# Altium integrated library iuh-thuc-hanh.IntLib: 62 symbols
Pins are listed as number, name and electrical type; pins without a type are passive.

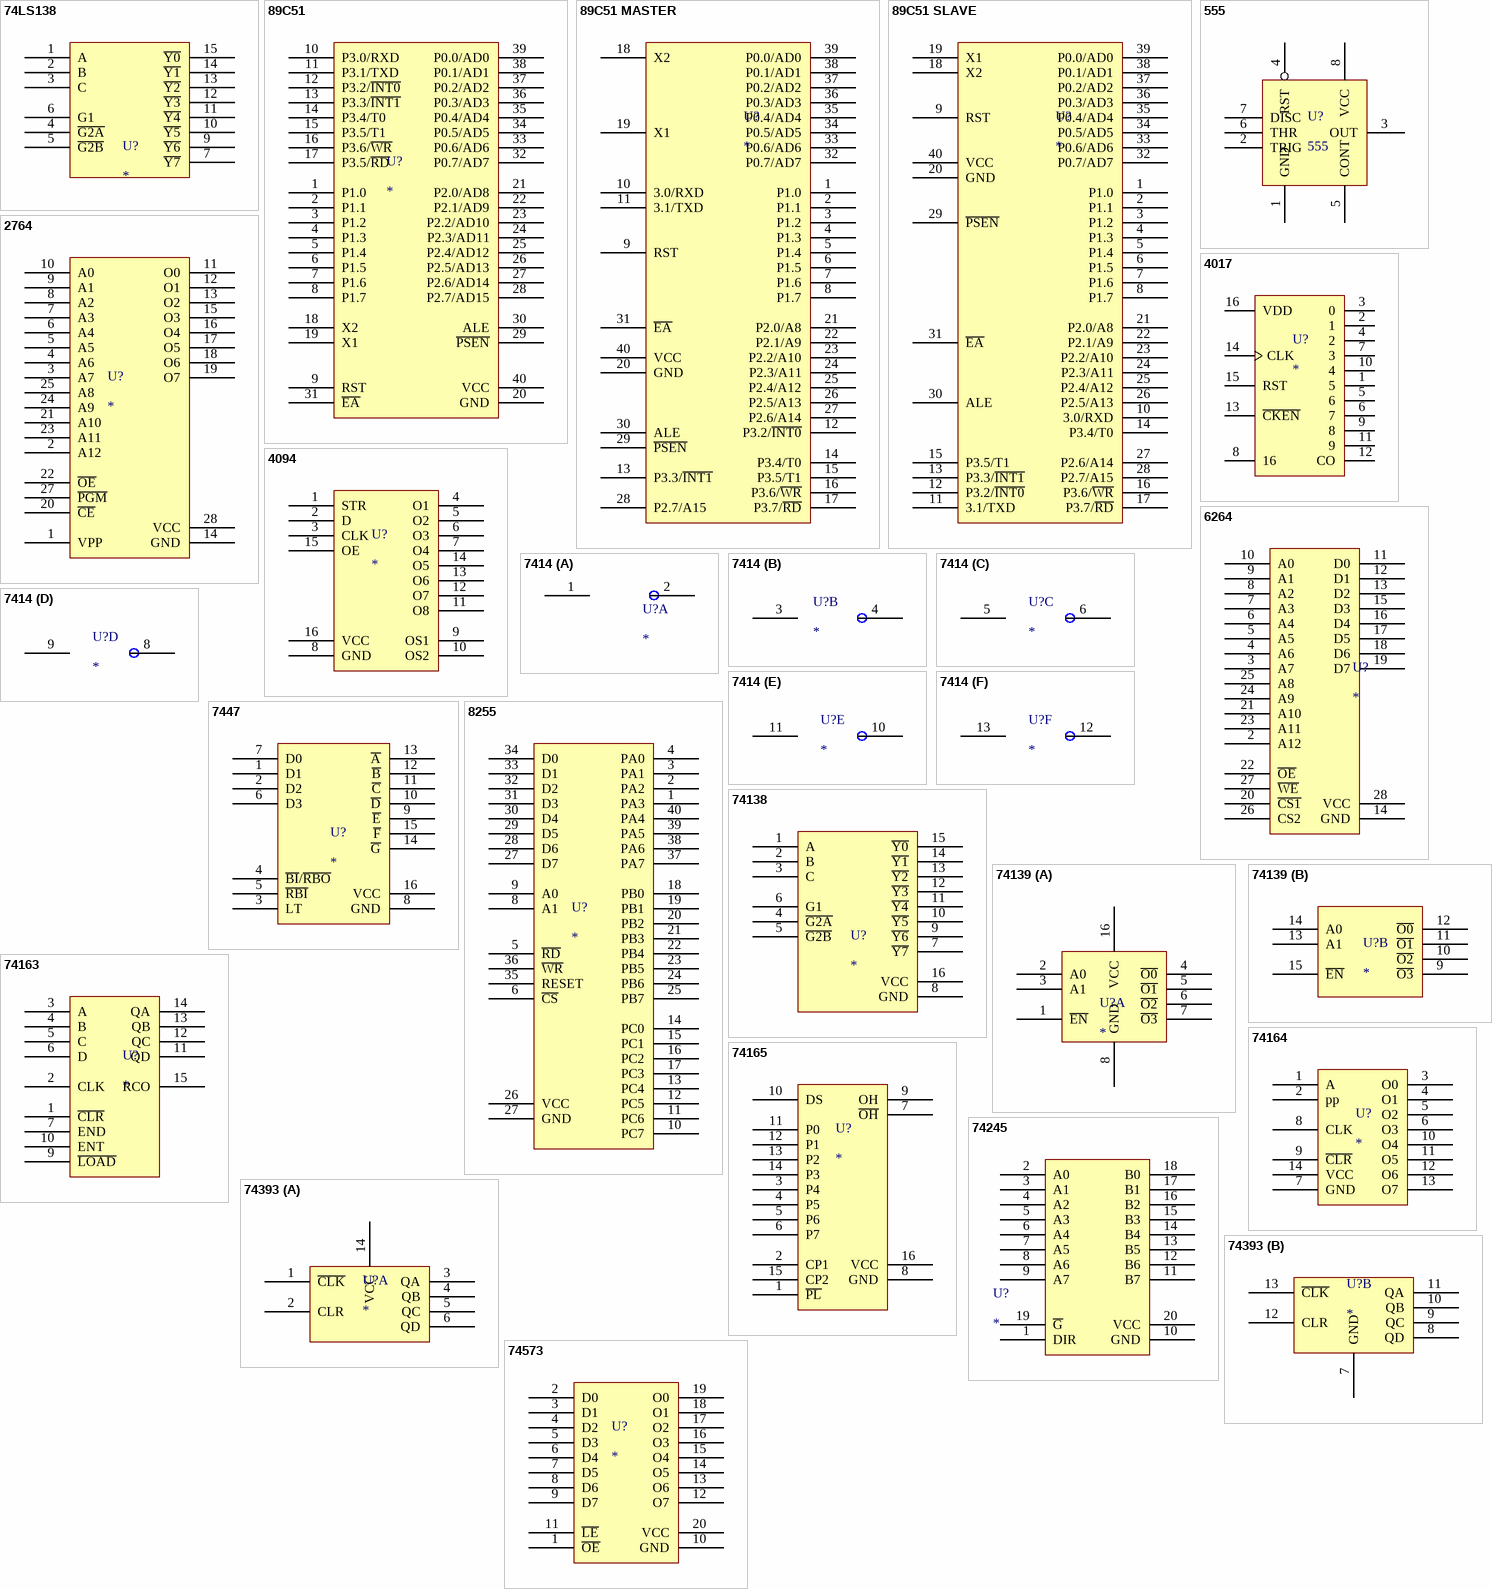
[diagram p0: symbols 74LS138 to 74573]

## 74LS138
designator U?
pins: 1 A, 2 B, 3 C, 4 ~{G2A}, 5 ~{G2B}, 6 G1, 7 ~{Y7}, 9 ~{Y6}, 10 ~{Y5}, 11 ~{Y4}, 12 ~{Y3}, 13 ~{Y2}, 14 ~{Y1}, 15 ~{Y0}

## 89C51
designator U?
pins: 1 P1.0, 2 P1.1, 3 P1.2, 4 P1.3, 5 P1.4, 6 P1.5, 7 P1.6, 8 P1.7, 9 RST, 10 P3.0/RXD, 11 P3.1/TXD, 12 P3.2/~{INT0}, 13 P3.3/~{INT1}, 14 P3.4/T0, 15 P3.5/T1, 16 P3.6/~{WR}, 17 P3.5/~{RD}, 18 X2, 19 X1, 20 GND, 21 P2.0/AD8, 22 P2.1/AD9, 23 P2.2/AD10, 24 P2.3/AD11, 25 P2.4/AD12, 26 P2.5/AD13, 27 P2.6/AD14, 28 P2.7/AD15, 29 ~{PSEN}, 30 ALE, 31 ~{EA}, 32 P0.7/AD7, 33 P0.6/AD6, 34 P0.5/AD5, 35 P0.4/AD4, 36 P0.3/AD3, 37 P0.2/AD2, 38 P0.1/AD1, 39 P0.0/AD0, 40 VCC

## 89C51 MASTER
designator U?
pins: 1 P1.0, 2 P1.1, 3 P1.2, 4 P1.3, 5 P1.4, 6 P1.5, 7 P1.6, 8 P1.7, 9 RST, 10 3.0/RXD, 11 3.1/TXD, 12 P3.2/~{INT0}, 13 P3.3/~{INT1}, 14 P3.4/T0, 15 P3.5/T1, 16 P3.6/~{WR}, 17 P3.7/~{RD}, 18 X2, 19 X1, 20 GND, 21 P2.0/A8, 22 P2.1/A9, 23 P2.2/A10, 24 P2.3/A11, 25 P2.4/A12, 26 P2.5/A13, 27 P2.6/A14, 28 P2.7/A15, 29 ~{PSEN}, 30 ALE, 31 ~{EA}, 32 P0.7/AD7, 33 P0.6/AD6, 34 P0.5/AD5, 35 P0.4/AD4, 36 P0.3/AD3, 37 P0.2/AD2, 38 P0.1/AD1, 39 P0.0/AD0, 40 VCC

## 89C51 SLAVE
designator U?
pins: 1 P1.0, 2 P1.1, 3 P1.2, 4 P1.3, 5 P1.4, 6 P1.5, 7 P1.6, 8 P1.7, 9 RST, 10 3.0/RXD, 11 3.1/TXD, 12 P3.2/~{INT0}, 13 P3.3/~{INT1}, 14 P3.4/T0, 15 P3.5/T1, 16 P3.6/~{WR}, 17 P3.7/~{RD}, 18 X2, 19 X1, 20 GND, 21 P2.0/A8, 22 P2.1/A9, 23 P2.2/A10, 24 P2.3/A11, 25 P2.4/A12, 26 P2.5/A13, 27 P2.6/A14, 28 P2.7/A15, 29 ~{PSEN}, 30 ALE, 31 ~{EA}, 32 P0.7/AD7, 33 P0.6/AD6, 34 P0.5/AD5, 35 P0.4/AD4, 36 P0.3/AD3, 37 P0.2/AD2, 38 P0.1/AD1, 39 P0.0/AD0, 40 VCC

## 555
designator U?
LM555; Manufacturer: National Semiconductor Corporation; ComponentLink1Description: Datasheet; ComponentLink1URL: https://datasheet.ciiva.com/19457/840579-19457377.pdf?src-supplier=Jameco
footprint DIP8 (8 PIN, Width 300mil, Pin to pin 100mil)
pins: 1 GND, 2 TRIG, 3 OUT, 4 RST, 5 CONT, 6 THR, 7 DISC, 8 VCC

## 2764
designator U?
pins: 1 VPP, 2 A12, 3 A7, 4 A6, 5 A5, 6 A4, 7 A3, 8 A2, 9 A1, 10 A0, 11 O0, 12 O1, 13 O2, 14 GND, 15 O3, 16 O4, 17 O5, 18 O6, 19 O7, 20 ~{CE}, 21 A10, 22 ~{OE}, 23 A11, 24 A9, 25 A8, 27 ~{PGM}, 28 VCC

## 4017
designator U?
footprint DIP16 (16 PIN, W 300mil, Pin to pin 100mil)
footprint SOP16 (SOIC, 16-Leads, Body 9.90x3.91mm, Pitch 1.27mm, IPC Medium Density)
pins: 1 5, 2 1, 3 0, 4 2, 5 6, 6 7, 7 3, 8 16, 9 8, 10 4, 11 9, 12 CO, 13 ~{CKEN}, 14 CLK, 15 RST, 16 VDD

## 4094
designator U?
pins: 1 STR, 2 D, 3 CLK, 4 O1, 5 O2, 6 O3, 7 O4, 8 GND, 9 OS1, 10 OS2, 11 O8, 12 O7, 13 O6, 14 O5, 15 OE, 16 VCC

## 6264
designator U?
pins: 2 A12, 3 A7, 4 A6, 5 A5, 6 A4, 7 A3, 8 A2, 9 A1, 10 A0, 11 D0, 12 D1, 13 D2, 14 GND, 15 D3, 16 D4, 17 D5, 18 D6, 19 D7, 20 ~{CS1}, 21 A10, 22 ~{OE}, 23 A11, 24 A9, 25 A8, 26 CS2, 27 ~{WE}, 28 VCC

## 7414
designator U?
part A pins: 1, 2
part B pins: 3, 4
part C pins: 5, 6
part D pins: 8, 9
part E pins: 10, 11
part F pins: 12, 13

## 7447
designator U?
pins: 1 D1, 2 D2, 3 LT, 4 ~{BI}/~{RBO}, 5 ~{RBI}, 6 D3, 7 D0, 8 GND, 9 ~{E}, 10 ~{D}, 11 ~{C}, 12 ~{B}, 13 ~{A}, 14 ~{G}, 15 ~{F}, 16 VCC

## 8255
designator U?
pins: 1 PA3, 2 PA2, 3 PA1, 4 PA0, 5 ~{RD}, 6 ~{CS}, 8 A1, 9 A0, 10 PC7, 11 PC6, 12 PC5, 13 PC4, 14 PC0, 15 PC1, 16 PC2, 17 PC3, 18 PB0, 19 PB1, 20 PB2, 21 PB3, 22 PB4, 23 PB5, 24 PB6, 25 PB7, 26 VCC, 27 D7, 27 GND, 28 D6, 29 D5, 30 D4, 31 D3, 32 D2, 33 D1, 34 D0, 35 RESET, 36 ~{WR}, 37 PA7, 38 PA6, 39 PA5, 40 PA4

## 74138
designator U?
pins: 1 A, 2 B, 3 C, 4 ~{G2A}, 5 ~{G2B}, 6 G1, 7 ~{Y7}, 8 GND, 9 ~{Y6}, 10 ~{Y5}, 11 ~{Y4}, 12 ~{Y3}, 13 ~{Y2}, 14 ~{Y1}, 15 ~{Y0}, 16 VCC

## 74139
designator U?
part A pins: 1 ~{EN}, 2 A0, 3 A1, 4 ~{O0}, 5 ~{O1}, 6 ~{O2}, 7 ~{O3}, 8 GND, 16 VCC
part B pins: 9 ~{O3}, 10 ~{O2}, 11 ~{O1}, 12 ~{O0}, 13 A1, 14 A0, 15 ~{EN}

## 74163
designator U?
pins: 1 ~{CLR}, 2 CLK, 3 A, 4 B, 5 C, 6 D, 7 END, 9 ~{LOAD}, 10 ENT, 11 QD, 12 QC, 13 QB, 14 QA, 15 RCO

## 74164
designator U?
pins: 1 A, 2 pp, 3 O0, 4 O1, 5 O2, 6 O3, 7 GND, 8 CLK, 9 ~{CLR}, 10 O4, 11 O5, 12 O6, 13 O7, 14 VCC

## 74165
designator U?
pins: 1 ~{PL}, 2 CP1, 3 P4, 4 P5, 5 P6, 6 P7, 7 ~{OH}, 8 GND, 9 OH, 10 DS, 11 P0, 12 P1, 13 P2, 14 P3, 15 CP2, 16 VCC

## 74245
designator U?
pins: 1 DIR, 2 A0, 3 A1, 4 A2, 5 A3, 6 A4, 7 A5, 8 A6, 9 A7, 10 GND, 11 B7, 12 B6, 13 B5, 14 B4, 15 B3, 16 B2, 17 B1, 18 B0, 19 ~{G}, 20 VCC

## 74393
designator U?
part A pins: 1 ~{CLK}, 2 CLR, 3 QA, 4 QB, 5 QC, 6 QD, 14 VCC
part B pins: 7 GND, 8 QD, 9 QC, 10 QB, 11 QA, 12 CLR, 13 ~{CLK}

## 74573
designator U?
pins: 1 ~{OE}, 2 D0, 3 D1, 4 D2, 5 D3, 6 D4, 7 D5, 8 D6, 9 D7, 10 GND, 11 ~{LE}, 12 O7, 13 O6, 14 O5, 15 O4, 16 O3, 17 O2, 18 O1, 19 O0, 20 VCC

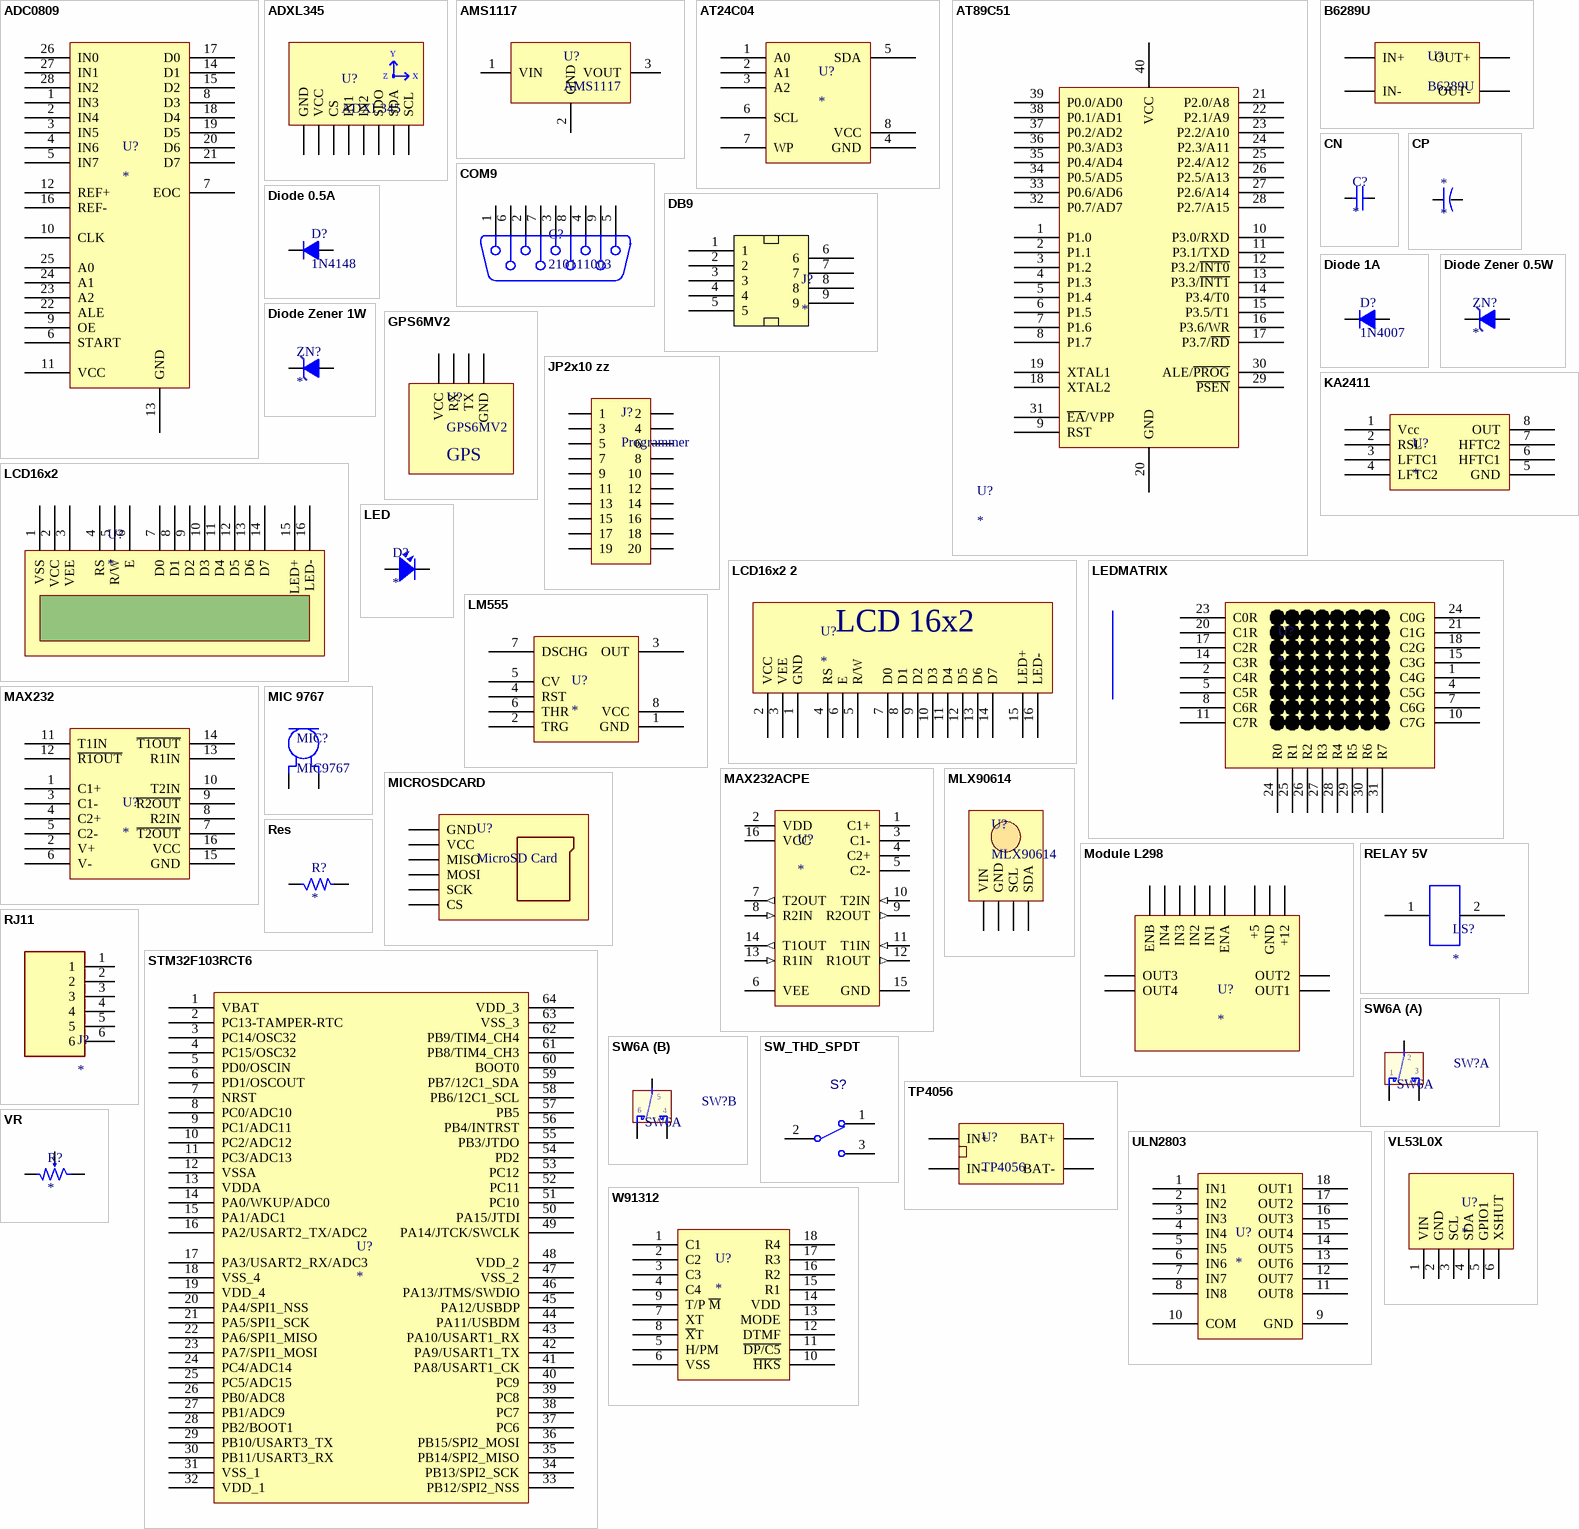
[diagram p1: symbols ADC0809 to W91312]

## ADC0809
designator U?
pins: 1 IN3, 2 IN4, 3 IN5, 4 IN6, 5 IN7, 6 START, 7 EOC, 8 D3, 9 OE, 10 CLK, 11 VCC, 12 REF+, 13 GND, 14 D1, 15 D2, 16 REF-, 17 D0, 18 D4, 19 D5, 20 D6, 21 D7, 22 ALE, 23 A2, 24 A1, 25 A0, 26 IN0, 27 IN1, 28 IN2

## ADXL345
designator U?
Module Cam bien gia toc
pins: 1 GND, 2 VCC, 3 CS, 4 IN1, 5 IN2, 6 SDO, 7 SDA, 8 SCL
text: Y; Z; X

## AMS1117
designator U?
pins: 1 VIN, 2 GND, 3 VOUT

## AT24C04
designator U?
pins: 1 A0, 2 A1, 3 A2, 4 GND, 5 SDA, 6 SCL, 7 WP, 8 VCC

## AT89C51
designator U?
pins: 1 P1.0, 2 P1.1, 3 P1.2, 4 P1.3, 5 P1.4, 6 P1.5, 7 P1.6, 8 P1.7, 9 RST, 10 P3.0/RXD, 11 P3.1/TXD, 12 P3.2/~{INT0}, 13 P3.3/~{INT1}, 14 P3.4/T0, 15 P3.5/T1, 16 P3.6/WR, 17 P3.7/~{RD}, 18 XTAL2, 19 XTAL1, 20 GND, 21 P2.0/A8, 22 P2.1/A9, 23 P2.2/A10, 24 P2.3/A11, 25 P2.4/A12, 26 P2.5/A13, 27 P2.6/A14, 28 P2.7/A15, 29 ~{PSEN}, 30 ALE/~{PROG}, 31 ~{EA}/VPP, 32 P0.7/AD7, 33 P0.6/AD6, 34 P0.5/AD5, 35 P0.4/AD4, 36 P0.3/AD3, 37 P0.2/AD2, 38 P0.1/AD1, 39 P0.0/AD0, 40 VCC

## B6289U
designator U?
Module Buck Boost 5V
pins: 1 IN+, 2 IN-, 3 OUT+, 4 OUT-

## CN
designator C?
Capacitor
footprint Cap 7.5mm
footprint Cap 2.54mm
footprint Cap 3.81mm
footprint Cap 5.08mm
footprint Cap 6.35mm (Tu pin to pin 250mil)
footprint Cap 10mm (Cap np W 0.4)
footprint Cap 15mm
footprint Cap 15mm CBB
footprint Cap 22.5mm
pins: 1, 2

## COM9
designator C?, comment 210111003
DB9 RS232 D-SUB-Filter Connectors WE-DS, Solder Pin Straight; Manufacturer: Würth Elektronik eiSos GmbH; partNo: 210111003; ComponentLink1Description: Manufacturer; ComponentLink1URL: http://www.we-online.de; Created by: Christin Zierenner; Created Date: May 2012; ComponentLink2Description: Datasheet; ComponentLink2URL: http://katalog.we-online.de/kataloge/eisos/index.php?language=en&pf=Filter_gerade
footprint COM9A (D-SUB- 9P, MALE, RT ANGLE, TH)
footprint COM9C (D-SUB- 9P, MALE, SOLDER BUCKET VERTICAL MOUNT, TH)
footprint COM9SMDA (D-SUB- 9P, MALE, RT ANGLE, SMT)
pins: 1, 2, 3, 4, 5, 6, 7, 8, 9

## CP
designator *
Capacitor
pins: 1, 2

## DB9
designator J?
pins: 1, 2, 3, 4, 5, 6, 7, 8, 9

## Diode 0.5A
designator D?, comment 1N4148
Diode 0.5A 1N4148 DO-35
footprint DO-35 (Diode 0.5A)
footprint DO-35 Axial (Diode 0.5A Axial)
pins: 1 A, 2 K

## Diode 1A
designator D?, comment 1N4007
Diode 1A 1N4007 DO-41
footprint DO-41 (Diode 1A)
footprint DO-41 Axial (Diode 1A Axial)
pins: 1 A, 2 K

## Diode Zener 0.5W
designator ZN?
footprint DO-35 (Diode 0.5A)
footprint DO-35 Axial (Diode 0.5A Axial)
pins: 1 A, 2 K

## Diode Zener 1W
designator ZN?
footprint DO-41 (Diode 1A)
footprint DO-41 Axial (Diode 1A Axial)
pins: 1 A, 2 K

## GPS6MV2
designator U?
Module GPS
pins: 1 VCC, 2 RX, 3 TX, 4 GND
text: GPS

## JP2x10 zz
designator J?, comment Programmer
pins: 1, 2, 3, 4, 5, 6, 7, 8, 9, 10, 11, 12, 13, 14, 15, 16, 17, 18, 19, 20

## KA2411
designator U?
footprint DIP8 (8 PIN, Width 300mil, Pin to pin 100mil)
pins: 1 Vcc, 2 RSL, 3 LFTC1, 4 LFTC2, 5 GND, 6 HFTC1, 7 HFTC2, 8 OUT

## LCD16x2
designator U?
LCD 16x2
pins: 1 VSS, 2 VCC, 3 VEE, 4 RS, 5 R/W, 6 E, 7 D0, 8 D1, 9 D2, 10 D3, 11 D4, 12 D5, 13 D6, 14 D7, 15 LED+, 16 LED-

## LCD16x2 2
designator U?
LCD 16x2
pins: 1 GND, 2 VCC, 3 VEE, 4 RS, 5 R/W, 6 E, 7 D0, 8 D1, 9 D2, 10 D3, 11 D4, 12 D5, 13 D6, 14 D7, 15 LED+, 16 LED-

## LED
designator D?
footprint LED-5MM-RED (LED 2 PIN, 5mm, Only colour,pin to pin 100mil)
pins: 1, 2

## LEDMATRIX
designator U?
pins: 1 C4G, 2 C4R, 4 C5G, 5 C5R, 7 C6G, 8 C6R, 10 C7G, 11 C7R, 14 C3R, 15 C3G, 17 C2R, 18 C2G, 20 C1R, 21 C1G, 23 C0R, 24 R0, 24 C0G, 25 R1, 26 R2, 27 R3, 28 R4, 29 R5, 30 R6, 31 R7

## LM555
designator U?
pins: 1 GND, 2 TRG, 3 OUT, 4 RST, 5 CV, 6 THR, 7 DSCHG, 8 VCC

## MAX232
designator U?
pins: 1 C1+, 2 V+, 3 C1-, 4 C2+, 5 C2-, 6 V-, 7 ~{T2OUT}, 8 R2IN, 9 ~{R2OUT}, 10 T2IN, 11 T1IN, 12 ~{R1OUT}, 13 R1IN, 14 ~{T1OUT}, 15 GND, 16 VCC

## MAX232ACPE
designator U?
pins: 1 C1+, 2 VDD, 3 C1-, 4 C2+, 5 C2-, 6 VEE, 7 T2OUT (out), 8 R2IN (in), 9 R2OUT (out), 10 T2IN (in), 11 T1IN (in), 12 R1OUT (out), 13 R1IN (in), 14 T1OUT (out), 15 GND, 16 VCC

## MIC 9767
designator MIC?, comment MIC9767
Microphone 9767 9.7x6.7mm; Pin distance: 2.54mm
footprint MICRONPHONE 9767
pins: 1 VCC (power), 2 GND (power)

## MICROSDCARD
designator U?, comment MicroSD Card
pins: 1 GND, 2 VCC, 3 MISO, 4 MOSI, 5 SCK, 6 CS

## MLX90614
designator U?
Cam bien nhiet do hong ngoai
pins: 1 VIN, 2 GND, 3 SCL, 4 SDA

## Module L298
designator U?
pins: 1 +12, 2 GND, 3 +5, 4 ENA, 5 IN1, 6 IN2, 7 IN3, 8 IN4, 9 ENB, 10 OUT2, 11 OUT1, 11 OUT3, 12 OUT4

## RELAY 5V
designator LS?
pins: 1, 2

## Res
designator R?
footprint RES-1/4W
pins: 1, 2

## RJ11
designator J?
RJ11 6P6C
footprint RJ11 6P6C
pins: 1, 2, 3, 4, 5, 6

## STM32F103RCT6
designator U?
pins: 1 VBAT, 2 PC13-TAMPER-RTC, 3 PC14/OSC32, 4 PC15/OSC32, 5 PD0/OSCIN, 6 PD1/OSCOUT, 7 NRST, 8 PC0/ADC10, 9 PC1/ADC11, 10 PC2/ADC12, 11 PC3/ADC13, 12 VSSA, 13 VDDA, 14 PA0/WKUP/ADC0, 15 PA1/ADC1, 16 PA2/USART2_TX/ADC2, 17 PA3/USART2_RX/ADC3, 18 VSS_4, 19 VDD_4, 20 PA4/SPI1_NSS, 21 PA5/SPI1_SCK, 22 PA6/SPI1_MISO, 23 PA7/SPI1_MOSI, 24 PC4/ADC14, 25 PC5/ADC15, 26 PB0/ADC8, 27 PB1/ADC9, 28 PB2/BOOT1, 29 PB10/USART3_TX, 30 PB11/USART3_RX, 31 VSS_1, 32 VDD_1, 33 PB12/SPI2_NSS, 34 PB13/SPI2_SCK, 35 PB14/SPI2_MISO, 36 PB15/SPI2_MOSI, 37 РС6, 38 PC7, 39 PC8, 40 PC9, 41 PA8/USART1_CK, 42 PA9/USART1_TX, 43 PA10/USART1_RX, 44 PA11/USBDM, 45 PA12/USBDP, 46 PA13/JTMS/SWDIO, 47 VSS_2, 48 VDD_2, 49 PA14/JTCK/SWCLK, 50 PA15/JTDI, 51 PC10, 52 PC11, 53 PC12, 54 PD2, 55 PB3/JTDO, 56 PB4/INTRST, 57 PB5, 58 PB6/12C1_SCL, 59 PB7/12C1_SDA, 60 BOOT0, 61 PB8/TIM4_CH3, 62 PB9/TIM4_CH4, 63 VSS_3, 64 VDD_3

## SW6A
designator SW?
SW-DTDP - 6 Pin; Value: SW6
footprint SWITCH DPDT 7x7mm 2mm
footprint SWITCH DPDT 8x8mm 2.5mm
part A pins: 1, 2, 3
part B pins: 4, 5, 6

## SW_THD_SPDT
designator S?
Switch THD vertical toggle SPDT; Manufacturer 1: TE Connectivity; Manufacturer Part Number 1: SLS121PC04; Contact Rating @ Voltage: 0.25A @ 125VAC; SCDType: spec; Circuit: SPDT; Mounting Type: PCB mount; Supplier 1: Digi-Key; Supplier Part Number 1: 450-1598-ND
footprint SWITCH SPDT 1P2T 2mm (TE Connectivity SLS121PC04 SPDT slider)
footprint SWITCH SPDT 1P2T 3mm
pins: 1, 2, 3

## TP4056
designator U?
Module sac pin
pins: 2 IN-, 2 BAT+, 3 IN+, 3 BAT-

## ULN2803
designator U?
pins: 1 IN1, 2 IN2, 3 IN3, 4 IN4, 5 IN5, 6 IN6, 7 IN7, 8 IN8, 9 GND, 10 COM, 11 OUT8, 12 OUT7, 13 OUT6, 14 OUT5, 15 OUT4, 16 OUT3, 17 OUT2, 18 OUT1

## VL53L0X
designator U?
pins: 1 VIN, 2 GND, 3 SCL, 4 SDA, 5 GPIO1, 6 XSHUT

## VR
designator R?
footprint VR-VCS (Volumn control single)
pins: 1, 2, 3

## W91312
designator U?
footprint DIP18 (18 PIN, W 300mil, Pin to pin 100mil)
pins: 1 C1, 2 C2, 3 C3, 4 C4, 5 H/PM, 6 VSS, 7 XT, 8 ~{X}T, 9 T/P ~{M}, 10 ~{HKS}, 11 ~{DP/C5}, 12 DTMF, 13 MODE, 14 VDD, 15 R1, 16 R2, 17 R3, 18 R4

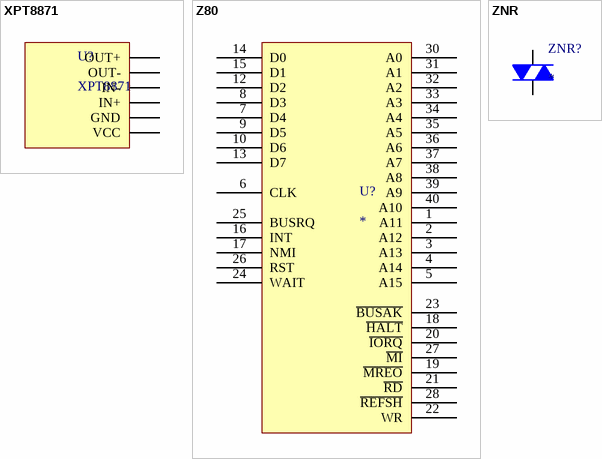
[diagram p2: symbols XPT8871 to ZNR]

## XPT8871
designator U?
pins: 1 VCC, 2 GND, 3 IN+, 4 IN-, 5 OUT-, 6 OUT+

## Z80
designator U?
pins: 1 A11, 2 A12, 3 A13, 4 A14, 5 A15, 6 CLK, 7 D4, 8 D3, 9 D5, 10 D6, 12 D2, 13 D7, 14 D0, 15 D1, 16 INT, 17 NMI, 18 ~{HALT}, 19 ~{MREO}, 20 ~{IORQ}, 21 ~{RD}, 22 WR, 23 ~{BUSAK}, 24 WAIT, 25 BUSRQ, 26 RST, 27 ~{MI}, 28 ~{REFSH}, 30 A0, 31 A1, 32 A2, 33 A3, 34 A4, 35 A5, 36 A6, 37 A7, 38 A8, 39 A9, 40 A10

## ZNR
designator ZNR?
MOV; Pin distance: 7.62mm
footprint Cap 7.5mm
pins: 1 A, 2 K